# Altium schematic symbol library SparkFun.SCHLIB: 796 symbols (part 5 of 5) (continued)
## USD-SOCKETNEW
designator U?, comment microSD SocketPush-push type uSD socket. Schematic element and footprint production proven. Spark Fun Electronics SKU : PRT-00127. tDoc lines correctly indicate media card edge positions when inserting (unlocked, locked, depressed).
footprint MICRO-SD-SOCKET-PP
pins: 1 NC, 2 CS, 3 DI, 4 VCC, 5 SCK, 6 GND, 7 DO, 8 RSV, CD1 SHIELD@2, CD2 SHIELD@4, GND1 SHIELD@3, GND3 SHIELD@1

## USD-SOCKETUSD
designator U?, comment microSD SocketPush-push type uSD socket. Schematic element and footprint production proven. Spark Fun Electronics SKU : PRT-00127. tDoc lines correctly indicate media card edge positions when inserting (unlocked, locked, depressed).
footprint USD-SOCKET-PP
pins: 1 NC, 2 CS, 3 DI, 4 VCC, 5 SCK, 6 GND, 7 DO, 8 RSV, CD1 SHIELD@1, CD2 SHIELD@2, GND1 SHIELD@3, GND2 SHIELD@4

## V18ZA2P
designator ?
footprint V18ZA2P
pins: P$1, P$2

## V-REFERENCESMD
designator ?
footprint SOT23-3
pins: 1 C, 2 A

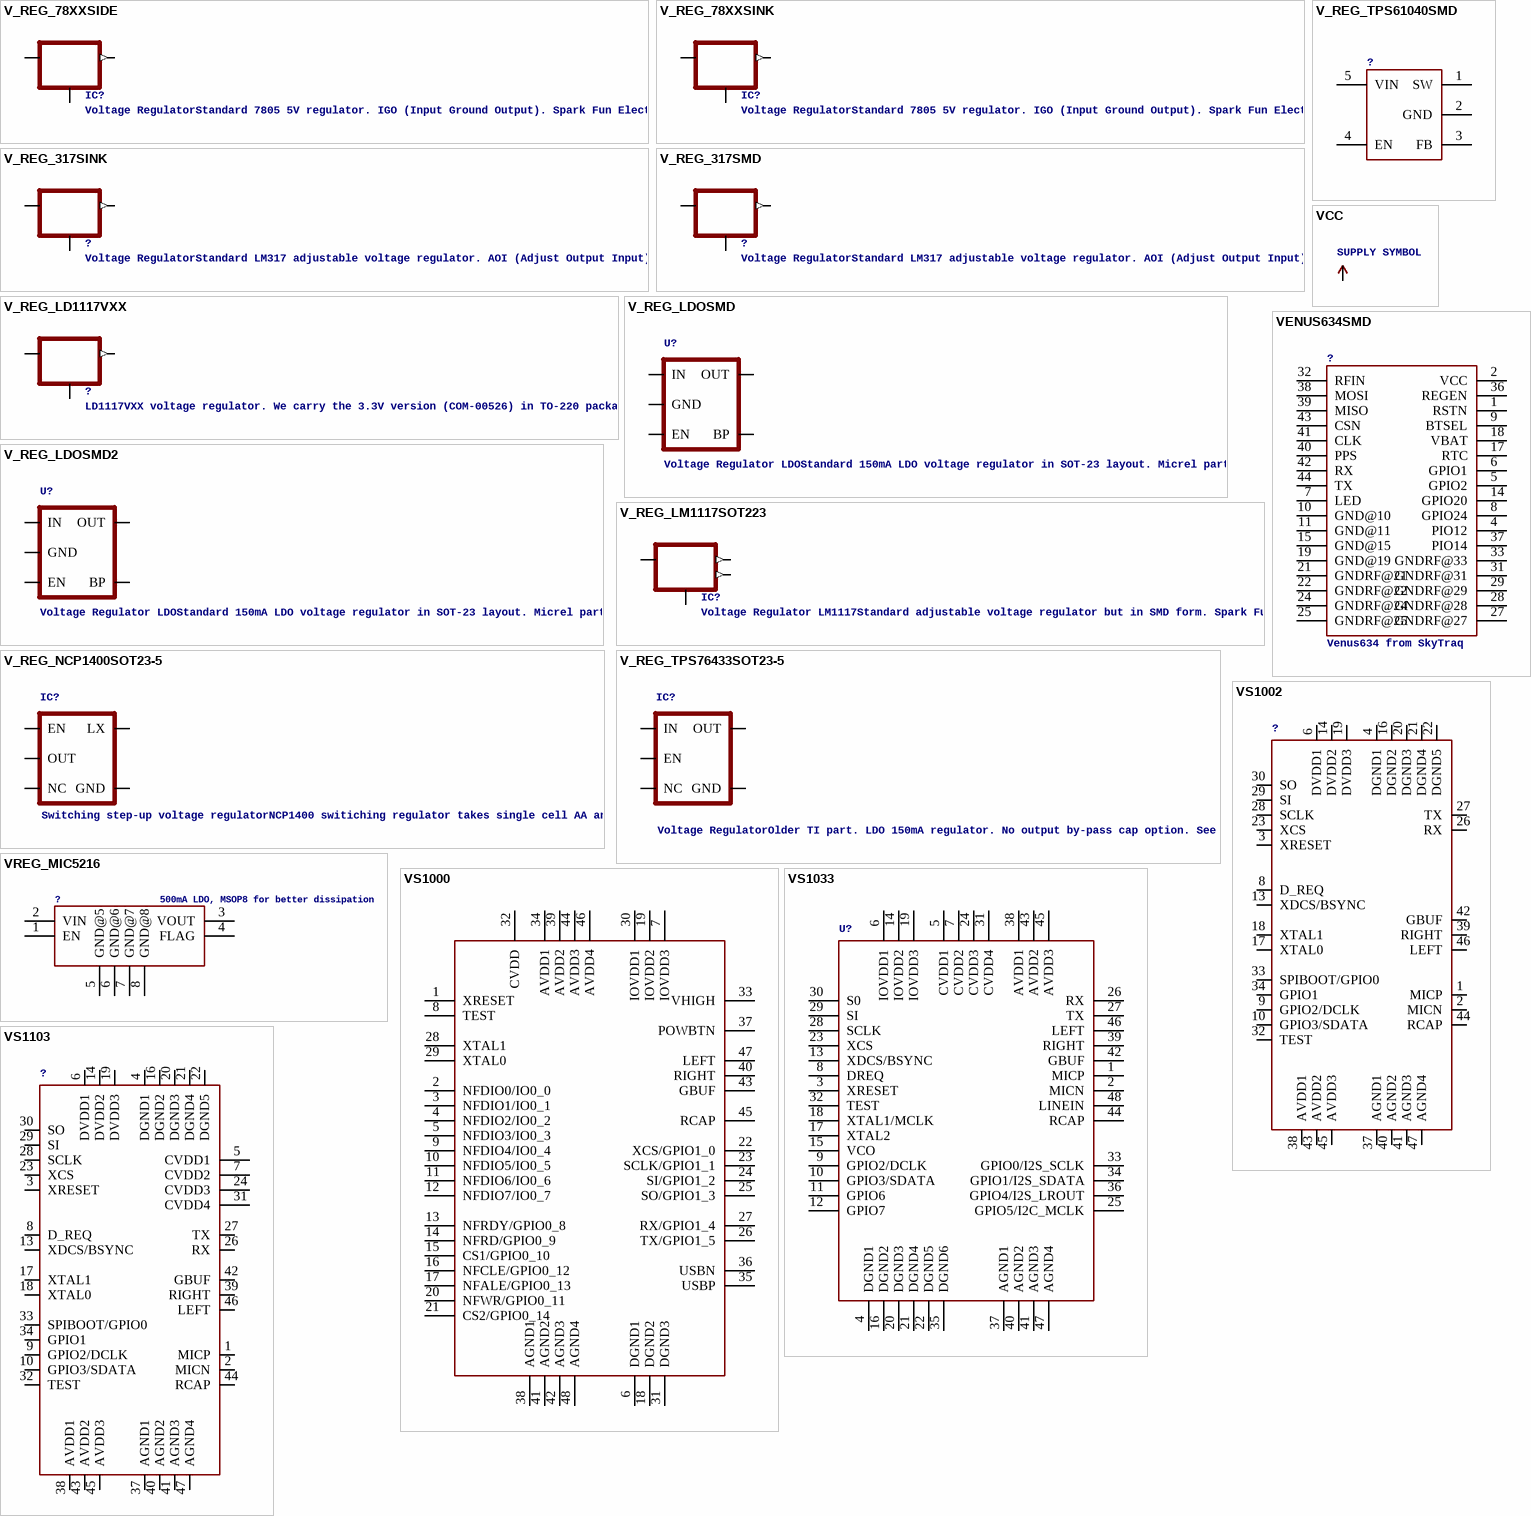
[diagram p34: symbols V_REG_78XXSIDE to VS1103]

## V_REG_78XXSIDE
designator IC?, comment Voltage RegulatorStandard 7805 5V regulator. IGO (Input Ground Output). Spark Fun Electronics SKU : COM-00107
footprint 78XXL
pins: GND, IN, OUT (out)

## V_REG_78XXSINK
designator IC?, comment Voltage RegulatorStandard 7805 5V regulator. IGO (Input Ground Output). Spark Fun Electronics SKU : COM-00107
footprint TO220-IGO
pins: GND, IN, OUT (out)

## V_REG_317SINK
designator ?, comment Voltage RegulatorStandard LM317 adjustable voltage regulator. AOI (Adjust Output Input). Google 'LM317 Calculator' for easy to use app to get the two resistor values needed. 240/720 for 5V output. 240/390 for 3.3V output. Spark Fun Electronics SKU : COM-00527
footprint TO220-ADJ
pins: ADJ, IN, OUT (out)

## V_REG_317SMD
designator ?, comment Voltage RegulatorStandard LM317 adjustable voltage regulator. AOI (Adjust Output Input). Google 'LM317 Calculator' for easy to use app to get the two resistor values needed. 240/720 for 5V output. 240/390 for 3.3V output. Spark Fun Electronics SKU : COM-00527
footprint SOT223
pins: 1 ADJ, 2 OUT (out), 3 IN

## V_REG_LD1117VXX
designator ?, comment LD1117VXX voltage regulator. We carry the 3.3V version (COM-00526) in TO-220 package.
footprint 78XXL
pins: GND OUT (out), IN GND, OUT IN

## V_REG_LDOSMD
designator U?, comment Voltage Regulator LDOStandard 150mA LDO voltage regulator in SOT-23 layout. Micrel part MIC5205. BP (by-pass) pin is used to lower output noise with 470pF cap.
footprint SOT23-5
pins: 1 IN, 2 GND, 3 EN, 4 BP, 5 OUT

## V_REG_LDOSMD2
designator U?, comment Voltage Regulator LDOStandard 150mA LDO voltage regulator in SOT-23 layout. Micrel part MIC5205. BP (by-pass) pin is used to lower output noise with 470pF cap.
footprint SC70
pins: 1 IN, 2 GND, 3 EN, 4 BP, 5 OUT

## V_REG_LM1117SOT223
designator IC?, comment Voltage Regulator LM1117Standard adjustable voltage regulator but in SMD form. Spark Fun Electronics SKU : COM-00595
footprint SOT223
pins: 1 ADJ, 2 OUT (out), 3 IN, 4 OUT@1 (out)

## V_REG_NCP1400SOT23-5
designator IC?, comment Switching step-up voltage regulatorNCP1400 switiching regulator takes single cell AA and outputs 100mA at 3.3V or 5V with minimal number of external components.
footprint SOT23-5
pins: 1 EN, 2 OUT, 3 NC, 4 GND, 5 LX

## V_REG_TPS61040SMD
designator ?
footprint SOT23-5
pins: 1 SW, 2 GND, 3 FB, 4 EN, 5 VIN

## V_REG_TPS76433SOT23-5
designator IC?, comment Voltage RegulatorOlder TI part. LDO 150mA regulator. No output by-pass cap option. See V_REG_LDO for a better part.
footprint SOT23-5
pins: 1 IN, 2 GND, 3 EN, 4 NC, 5 OUT

## VCC
designator P+?, comment SUPPLY SYMBOL
pins: ?1 VCC (oe)

## VENUS634SMD
designator ?, comment Venus634 from SkyTraq
footprint LGA44
pins: 1 RSTN, 2 VCC, 4 PIO12, 5 GPIO2, 6 GPIO1, 7 LED, 8 GPIO24, 9 BTSEL, 10 GND@10, 11 GND@11, 14 GPIO20, 15 GND@15, 17 RTC, 18 VBAT, 19 GND@19, 21 GNDRF@21, 22 GNDRF@22, 24 GNDRF@24, 25 GNDRF@25, 27 GNDRF@27, 28 GNDRF@28, 29 GNDRF@29, 31 GNDRF@31, 32 RFIN, 33 GNDRF@33, 36 REGEN, 37 PIO14, 38 MOSI, 39 MISO, 40 PPS, 41 CLK, 42 RX, 43 CSN, 44 TX

## VREG_MIC5216
designator ?, comment 500mA LDO, MSOP8 for better dissipation
footprint MSOP8
pins: 1 EN, 2 VIN, 3 VOUT, 4 FLAG, 5 GND@5, 6 GND@6, 7 GND@7, 8 GND@8

## VS1000
designator ?
footprint LQFP-48
pins: 1 XRESET, 2 NFDIO0/IO0_0, 3 NFDIO1/IO0_1, 4 NFDIO2/IO0_2, 5 NFDIO3/IO0_3, 6 DGND1, 7 IOVDD3, 8 TEST, 9 NFDIO4/IO0_4, 10 NFDIO5/IO0_5, 11 NFDIO6/IO0_6, 12 NFDIO7/IO0_7, 13 NFRDY/GPIO0_8, 14 NFRD/GPIO0_9, 15 CS1/GPIO0_10, 16 NFCLE/GPIO0_12, 17 NFALE/GPIO0_13, 18 DGND2, 19 IOVDD2, 20 NFWR/GPIO0_11, 21 CS2/GPIO0_14, 22 XCS/GPIO1_0, 23 SCLK/GPIO1_1, 24 SI/GPIO1_2, 25 SO/GPIO1_3, 26 TX/GPIO1_5, 27 RX/GPIO1_4, 28 XTAL1, 29 XTAL0, 30 IOVDD1, 31 DGND3, 32 CVDD, 33 VHIGH, 34 AVDD1, 35 USBP, 36 USBN, 37 POWBTN, 38 AGND1, 39 AVDD2, 40 RIGHT, 41 AGND2, 42 AGND3, 43 GBUF, 44 AVDD3, 45 RCAP, 46 AVDD4, 47 LEFT, 48 AGND4

## VS1002
designator ?
footprint LQFP-48
pins: 1 MICP, 2 MICN, 3 XRESET, 4 DGND1 (power), 6 DVDD1 (power), 8 D_REQ, 9 GPIO2/DCLK, 10 GPIO3/SDATA, 13 XDCS/BSYNC, 14 DVDD2 (power), 16 DGND2, 17 XTAL0, 18 XTAL1, 19 DVDD3 (power), 20 DGND3, 21 DGND4, 22 DGND5, 23 XCS, 26 RX, 27 TX, 28 SCLK, 29 SI, 30 SO, 32 TEST, 33 SPIBOOT/GPIO0, 34 GPIO1, 37 AGND1, 38 AVDD1 (power), 39 RIGHT, 40 AGND2, 41 AGND3, 42 GBUF, 43 AVDD2 (power), 44 RCAP, 45 AVDD3 (power), 46 LEFT, 47 AGND4

## VS1033
designator U?
footprint LQFP-48
pins: 1 MICP, 2 MICN, 3 XRESET, 4 DGND1, 5 CVDD1, 6 IOVDD1, 7 CVDD2, 8 DREQ, 9 GPIO2/DCLK, 10 GPIO3/SDATA, 11 GPIO6, 12 GPIO7, 13 XDCS/BSYNC, 14 IOVDD2, 15 VCO, 16 DGND2, 17 XTAL2, 18 XTAL1/MCLK, 19 IOVDD3, 20 DGND3, 21 DGND4, 22 DGND5, 23 XCS, 24 CVDD3, 25 GPIO5/I2C_MCLK, 26 RX, 27 TX, 28 SCLK, 29 SI, 30 S0, 31 CVDD4, 32 TEST, 33 GPIO0/I2S_SCLK, 34 GPIO1/I2S_SDATA, 35 DGND6, 36 GPIO4/I2S_LROUT, 37 AGND1, 38 AVDD1, 39 RIGHT, 40 AGND2, 41 AGND3, 42 GBUF, 43 AVDD2, 44 RCAP, 45 AVDD3, 46 LEFT, 47 AGND4, 48 LINEIN

## VS1103
designator ?
footprint LQFP-48
pins: 1 MICP, 2 MICN, 3 XRESET, 4 DGND1 (power), 5 CVDD1, 6 DVDD1 (power), 7 CVDD2, 8 D_REQ, 9 GPIO2/DCLK, 10 GPIO3/SDATA, 13 XDCS/BSYNC, 14 DVDD2 (power), 16 DGND2, 17 XTAL1, 18 XTAL0, 19 DVDD3 (power), 20 DGND3, 21 DGND4, 22 DGND5, 23 XCS, 24 CVDD3, 26 RX, 27 TX, 28 SCLK, 29 SI, 30 SO, 31 CVDD4, 32 TEST, 33 SPIBOOT/GPIO0, 34 GPIO1, 37 AGND1, 38 AVDD1 (power), 39 RIGHT, 40 AGND2, 41 AGND3, 42 GBUF, 43 AVDD2 (power), 44 RCAP, 45 AVDD3 (power), 46 LEFT, 47 AGND4

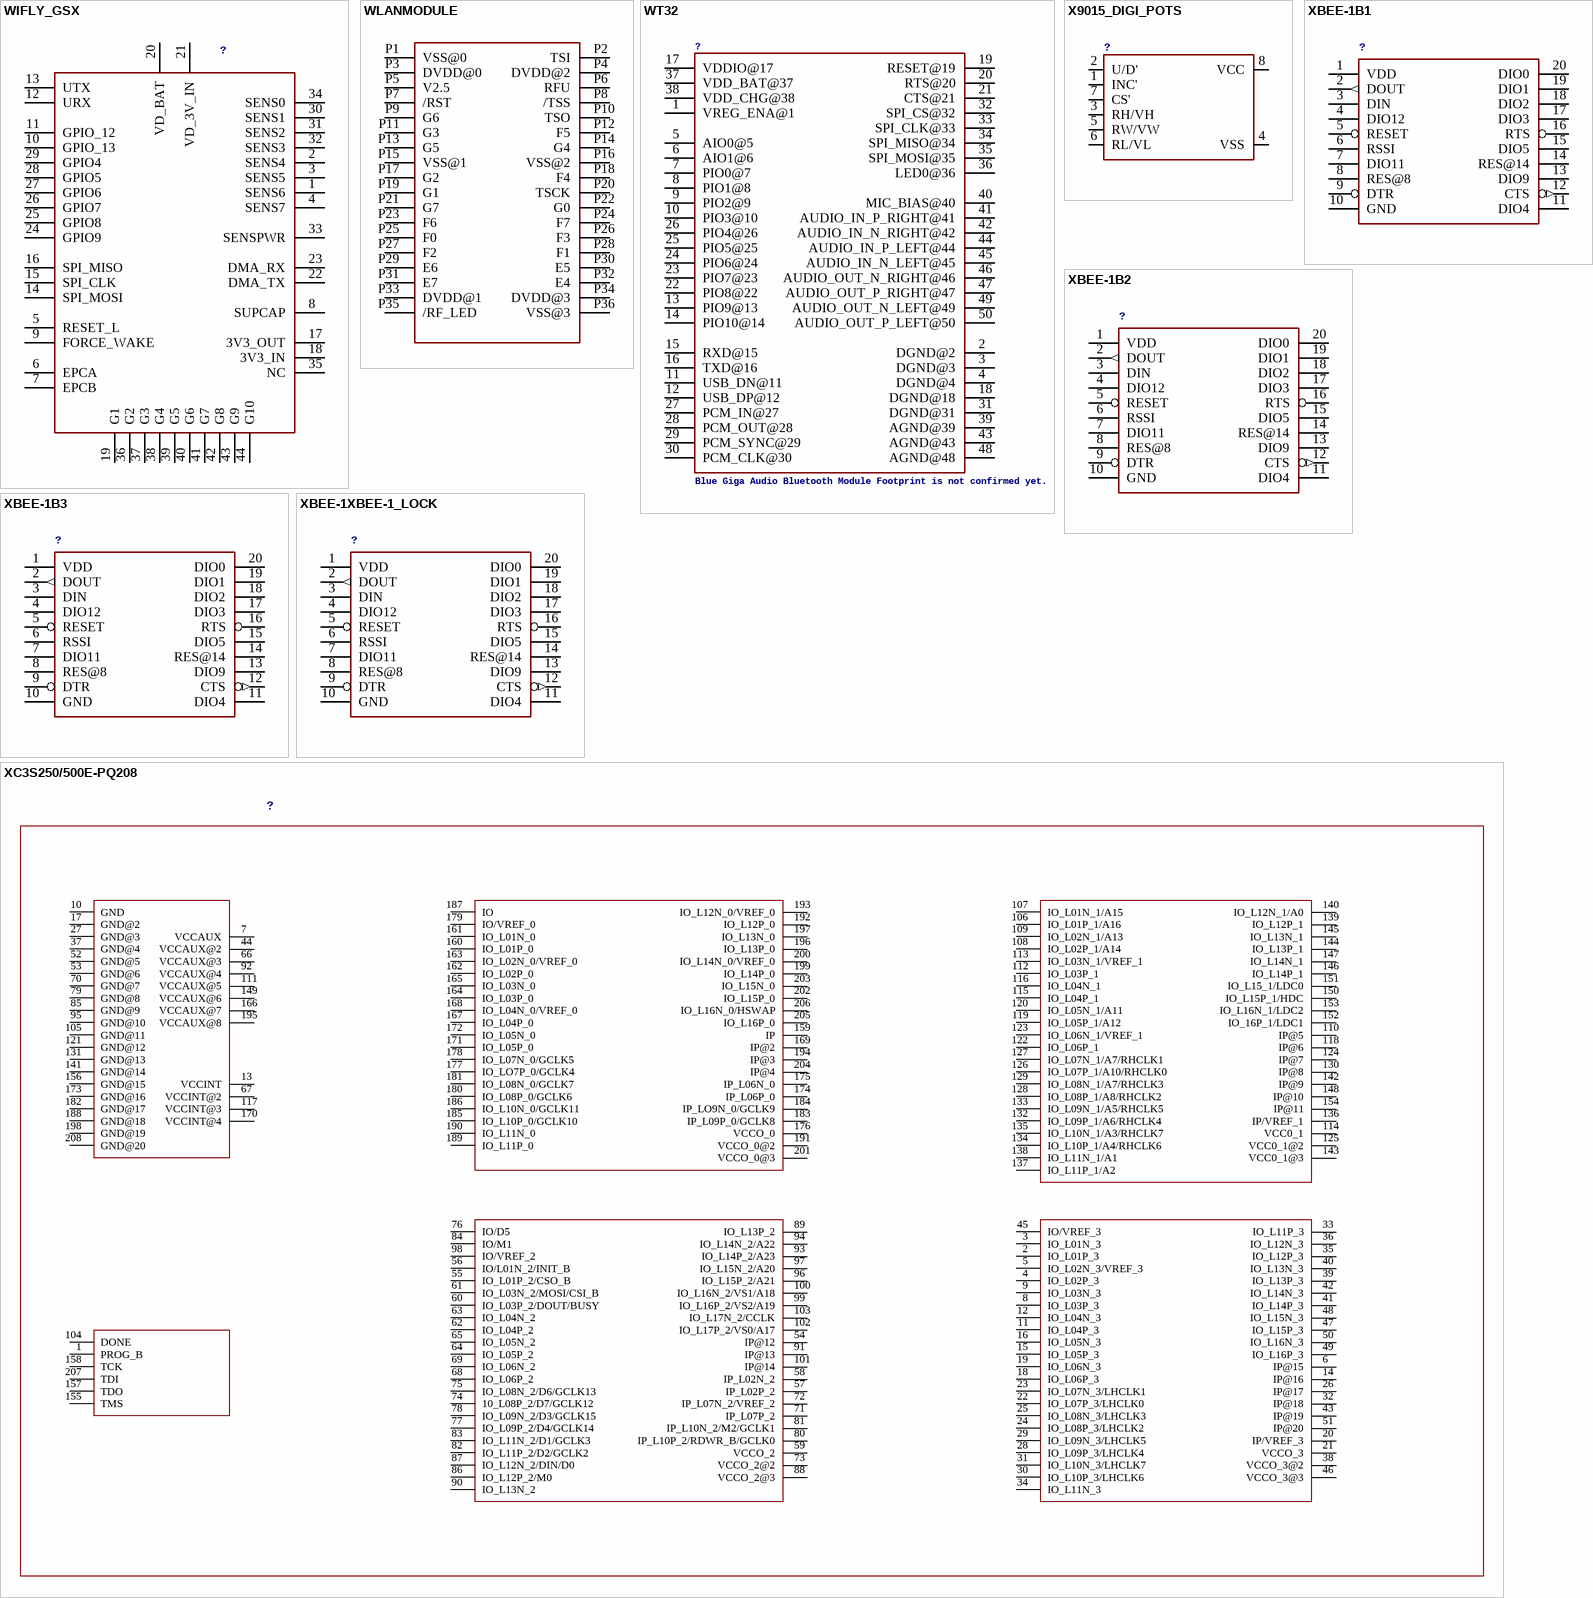
[diagram p35: symbols WIFLY_GSX to XC3S250/500E-PQ208]

## WIFLY_GSX
designator ?
footprint WIFLY_GSX
pins: 1 SENS6, 2 SENS4, 3 SENS5, 4 SENS7, 5 RESET_L, 6 EPCA, 7 EPCB, 8 SUPCAP, 9 FORCE_WAKE, 10 GPIO_13, 11 GPIO_12, 12 URX, 13 UTX, 14 SPI_MOSI, 15 SPI_CLK, 16 SPI_MISO, 17 3V3_OUT, 18 3V3_IN, 19 G1, 20 VD_BAT, 21 VD_3V_IN, 22 DMA_TX, 23 DMA_RX, 24 GPIO9, 25 GPIO8, 26 GPIO7, 27 GPIO6, 28 GPIO5, 29 GPIO4, 30 SENS1, 31 SENS2, 32 SENS3, 33 SENSPWR, 34 SENS0, 35 NC, 36 G2, 37 G3, 38 G4, 39 G5, 40 G6, 41 G7, 42 G8, 43 G9, 44 G10

## WLANMODULE
designator ?, comment DPAC WiFi ModuleFootprint for DPAC wireless module. Not fully tested so double check it. Spark Fun Electronics SKU : (Module) WRL-00665, (Connector) WRL-00673  (value not drawn)
footprint WLANMODULE
pins: P1 VSS@0, P2 TSI, P3 DVDD@0, P4 DVDD@2, P5 V2.5, P6 RFU, P7 /RST, P8 /TSS, P9 G6, P10 TSO, P11 G3, P12 F5, P13 G5, P14 G4, P15 VSS@1, P16 VSS@2, P17 G2, P18 F4, P19 G1, P20 TSCK, P21 G7, P22 G0, P23 F6, P24 F7, P25 F0, P26 F3, P27 F2, P28 F1, P29 E6, P30 E5, P31 E7, P32 E4, P33 DVDD@1, P34 DVDD@3, P35 /RF_LED, P36 VSS@3

## WT32
designator ?, comment Blue Giga Audio Bluetooth Module Footprint is not confirmed yet.
footprint WT32
pins: 1 VREG_ENA@1, 2 DGND@2, 3 DGND@3, 4 DGND@4, 5 AIO0@5, 6 AIO1@6, 7 PIO0@7, 8 PIO1@8, 9 PIO2@9, 10 PIO3@10, 11 USB_DN@11, 12 USB_DP@12, 13 PIO9@13, 14 PIO10@14, 15 RXD@15, 16 TXD@16, 17 VDDIO@17, 18 DGND@18, 19 RESET@19, 20 RTS@20, 21 CTS@21, 22 PIO8@22, 23 PIO7@23, 24 PIO6@24, 25 PIO5@25, 26 PIO4@26, 27 PCM_IN@27, 28 PCM_OUT@28, 29 PCM_SYNC@29, 30 PCM_CLK@30, 31 DGND@31, 32 SPI_CS@32, 33 SPI_CLK@33, 34 SPI_MISO@34, 35 SPI_MOSI@35, 36 LED0@36, 37 VDD_BAT@37, 38 VDD_CHG@38, 39 AGND@39, 40 MIC_BIAS@40, 41 AUDIO_IN_P_RIGHT@41, 42 AUDIO_IN_N_RIGHT@42, 43 AGND@43, 44 AUDIO_IN_P_LEFT@44, 45 AUDIO_IN_N_LEFT@45, 46 AUDIO_OUT_N_RIGHT@46, 47 AUDIO_OUT_P_RIGHT@47, 48 AGND@48, 49 AUDIO_OUT_N_LEFT@49, 50 AUDIO_OUT_P_LEFT@50

## X9015_DIGI_POTS
designator ?
footprint SO08
pins: 1 INC', 2 U/D', 3 RH/VH, 4 VSS (power), 5 RW/VW, 6 RL/VL, 7 CS', 8 VCC (power)

## XBEE-1B1
designator ?
footprint XBEE-1
pins: 1 VDD (power), 2 DOUT (out), 3 DIN, 4 DIO12, 5 RESET, 6 RSSI, 7 DIO11, 8 RES@8, 9 DTR, 10 GND (power), 11 DIO4, 12 CTS (out), 13 DIO9, 14 RES@14, 15 DIO5, 16 RTS, 17 DIO3, 18 DIO2, 19 DIO1, 20 DIO0

## XBEE-1B2
designator ?
footprint XBEE-SILK
pins: 1 VDD (power), 2 DOUT (out), 3 DIN, 4 DIO12, 5 RESET, 6 RSSI, 7 DIO11, 8 RES@8, 9 DTR, 10 GND (power), 11 DIO4, 12 CTS (out), 13 DIO9, 14 RES@14, 15 DIO5, 16 RTS, 17 DIO3, 18 DIO2, 19 DIO1, 20 DIO0

## XBEE-1B3
designator ?
footprint XBEE-SMD
pins: 1 VDD (power), 2 DOUT (out), 3 DIN, 4 DIO12, 5 RESET, 6 RSSI, 7 DIO11, 8 RES@8, 9 DTR, 10 GND (power), 11 DIO4, 12 CTS (out), 13 DIO9, 14 RES@14, 15 DIO5, 16 RTS, 17 DIO3, 18 DIO2, 19 DIO1, 20 DIO0

## XBEE-1XBEE-1_LOCK
designator ?
footprint XBEE-1_LOCK
pins: 1 VDD (power), 2 DOUT (out), 3 DIN, 4 DIO12, 5 RESET, 6 RSSI, 7 DIO11, 8 RES@8, 9 DTR, 10 GND (power), 11 DIO4, 12 CTS (out), 13 DIO9, 14 RES@14, 15 DIO5, 16 RTS, 17 DIO3, 18 DIO2, 19 DIO1, 20 DIO0

## XC3S250/500E-PQ208
designator ?
footprint PQ208
pins: 1 PROG_B, 2 IO_L01P_3, 3 IO_L01N_3, 4 IO_L02P_3, 5 IO_L02N_3/VREF_3, 6 IP@15, 7 VCCAUX, 8 IO_L03P_3, 9 IO_L03N_3, 10 GND, 11 IO_L04P_3, 12 IO_L04N_3, 13 VCCINT, 14 IP@16, 15 IO_L05P_3, 16 IO_L05N_3, 17 GND@2, 18 IO_L06P_3, 19 IO_L06N_3, 20 IP/VREF_3, 21 VCCO_3, 22 IO_L07P_3/LHCLK0, 23 IO_L07N_3/LHCLK1, 24 IO_L08P_3/LHCLK2, 25 IO_L08N_3/LHCLK3, 26 IP@17, 27 GND@3, 28 IO_L09P_3/LHCLK4, 29 IO_L09N_3/LHCLK5, 30 IO_L10P_3/LHCLK6, 31 IO_L10N_3/LHCLK7, 32 IP@18, 33 IO_L11P_3, 34 IO_L11N_3, 35 IO_L12P_3, 36 IO_L12N_3, 37 GND@4, 38 VCCO_3@2, 39 IO_L13P_3, 40 IO_L13N_3, 41 IO_L14P_3, 42 IO_L14N_3, 43 IP@19, 44 VCCAUX@2, 45 IO/VREF_3, 46 VCCO_3@3, 47 IO_L15P_3, 48 IO_L15N_3, 49 IO_L16P_3, 50 IO_L16N_3, 51 IP@20, 52 GND@5, 53 GND@6, 54 IP@12, 55 IO_L01P_2/CSO_B, 56 IO/L01N_2/INIT_B, 57 IP_L02P_2, 58 IP_L02N_2, 59 VCCO_2, 60 IO_L03P_2/DOUT/BUSY, 61 IO_L03N_2/MOSI/CSI_B, 62 IO_L04P_2, 63 IO_L04N_2, 64 IO_L05P_2, 65 IO_L05N_2, 66 VCCAUX@3, 67 VCCINT@2, 68 IO_L06P_2, 69 IO_L06N_2, 70 GND@7, 71 IP_L07P_2, 72 IP_L07N_2/VREF_2, 73 VCCO_2@2, 74 10_L08P_2/D7/GCLK12, 75 IO_L08N_2/D6/GCLK13, 76 IO/D5, 77 IO_L09P_2/D4/GCLK14, 78 IO_L09N_2/D3/GCLK15, 79 GND@8, 80 IP_L10P_2/RDWR_B/GCLK0, 81 IP_L10N_2/M2/GCLK1, 82 IO_L11P_2/D2/GCLK2, 83 IO_L11N_2/D1/GCLK3, 84 IO/M1, 85 GND@9, 86 IO_L12P_2/M0, 87 IO_L12N_2/DIN/D0, 88 VCCO_2@3, 89 IO_L13P_2, 90 IO_L13N_2, 91 IP@13, 92 VCCAUX@4, 93 IO_L14P_2/A23, 94 IO_L14N_2/A22, 95 GND@10, 96 IO_L15P_2/A21, 97 IO_L15N_2/A20, 98 IO/VREF_2, 99 IO_L16P_2/VS2/A19, 100 IO_L16N_2/VS1/A18, 101 IP@14, 102 IO_L17P_2/VS0/A17, 103 IO_L17N_2/CCLK, 104 DONE, 105 GND@11, 106 IO_L01P_1/A16, 107 IO_L01N_1/A15, 108 IO_L02P_1/A14, 109 IO_L02N_1/A13, 110 IP@5, 111 VCCAUX@5, 112 IO_L03P_1, 113 IO_L03N_1/VREF_1, 114 VCC0_1, 115 IO_L04P_1, 116 IO_L04N_1, 117 VCCINT@3, 118 IP@6, 119 IO_L05P_1/A12, 120 IO_L05N_1/A11, 121 GND@12, 122 IO_L06P_1, 123 IO_L06N_1/VREF_1, 124 IP@7, 125 VCC0_1@2, 126 IO_L07P_1/A10/RHCLK0, 127 IO_L07N_1/A7/RHCLK1, 128 IO_L08P_1/A8/RHCLK2, 129 IO_L08N_1/A7/RHCLK3, 130 IP@8, 131 GND@13, 132 IO_L09P_1/A6/RHCLK4, 133 IO_L09N_1/A5/RHCLK5, 134 IO_L10P_1/A4/RHCLK6, 135 IO_L10N_1/A3/RHCLK7, 136 IP/VREF_1, 137 IO_L11P_1/A2, 138 IO_L11N_1/A1, 139 IO_L12P_1, 140 IO_L12N_1/A0, 141 GND@14, 142 IP@9, 143 VCC0_1@3, 144 IO_L13P_1, 145 IO_L13N_1, 146 IO_L14P_1, 147 IO_L14N_1, 148 IP@10, 149 VCCAUX@6, 150 IO_L15P_1/HDC, 151 IO_L15_1/LDC0, 152 IO_16P_1/LDC1, 153 IO_L16N_1/LDC2, 154 IP@11, 155 TMS, 156 GND@15, 157 TDO, 158 TCK, 159 IP, 160 IO_L01P_0, 161 IO_L01N_0, 162 IO_L02P_0, 163 IO_L02N_0/VREF_0, 164 IO_L03P_0, 165 IO_L03N_0, 166 VCCAUX@7, 167 IO_L04P_0, 168 IO_L04N_0/VREF_0, 169 IP@2, 170 VCCINT@4, 171 IO_L05P_0, 172 IO_L05N_0, 173 GND@16, 174 IP_L06P_0, 175 IP_L06N_0, 176 VCCO_0, 177 IO_LO7P_0/GCLK4, 178 IO_L07N_0/GCLK5, 179 IO/VREF_0, 180 IO_L08P_0/GCLK6, 181 IO_L08N_0/GCLK7, 182 GND@17, 183 IP_L09P_0/GCLK8, 184 IP_LO9N_0/GCLK9, 185 IO_L10P_0/GCLK10, 186 IO_L10N_0/GCLK11, 187 IO, 188 GND@18, 189 IO_L11P_0, 190 IO_L11N_0, 191 VCCO_0@2, 192 IO_L12P_0, 193 IO_L12N_0/VREF_0, 194 IP@3, 195 VCCAUX@8, 196 IO_L13P_0, 197 IO_L13N_0, 198 GND@19, 199 IO_L14P_0, 200 IO_L14N_0/VREF_0, 201 VCCO_0@3, 202 IO_L15P_0, 203 IO_L15N_0, 204 IP@4, 205 IO_L16P_0, 206 IO_L16N_0/HSWAP, 207 TDI, 208 GND@20

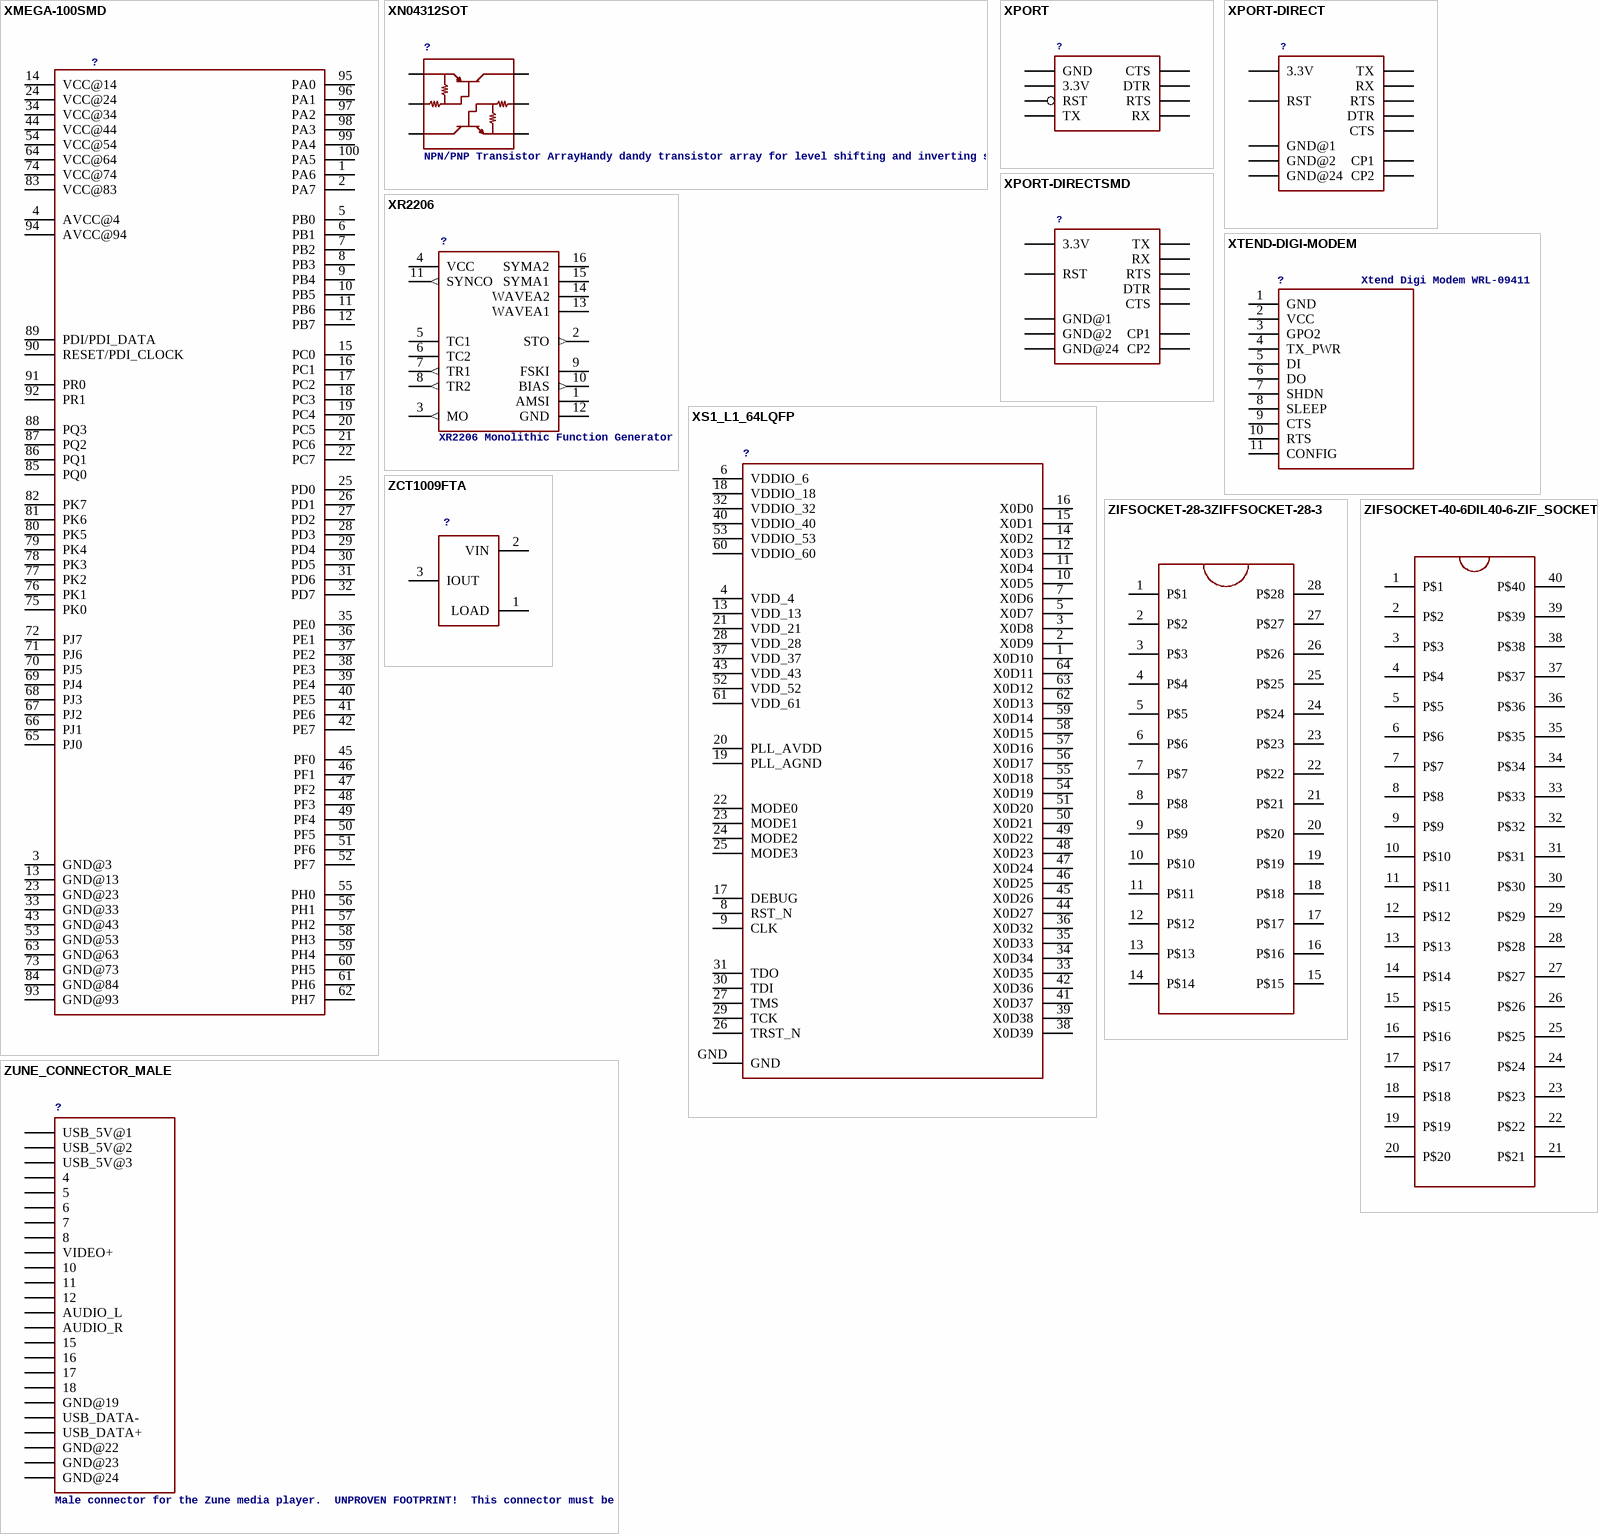
[diagram p36: symbols XMEGA-100SMD to ZUNE_CONNECTOR_MALE]

## XMEGA-100SMD
designator ?
footprint TQFP-100
pins: 1 PA6, 2 PA7, 3 GND@3, 4 AVCC@4, 5 PB0, 6 PB1, 7 PB2, 8 PB3, 9 PB4, 10 PB5, 11 PB6, 12 PB7, 13 GND@13, 14 VCC@14, 15 PC0, 16 PC1, 17 PC2, 18 PC3, 19 PC4, 20 PC5, 21 PC6, 22 PC7, 23 GND@23, 24 VCC@24, 25 PD0, 26 PD1, 27 PD2, 28 PD3, 29 PD4, 30 PD5, 31 PD6, 32 PD7, 33 GND@33, 34 VCC@34, 35 PE0, 36 PE1, 37 PE2, 38 PE3, 39 PE4, 40 PE5, 41 PE6, 42 PE7, 43 GND@43, 44 VCC@44, 45 PF0, 46 PF1, 47 PF2, 48 PF3, 49 PF4, 50 PF5, 51 PF6, 52 PF7, 53 GND@53, 54 VCC@54, 55 PH0, 56 PH1, 57 PH2, 58 PH3, 59 PH4, 60 PH5, 61 PH6, 62 PH7, 63 GND@63, 64 VCC@64, 65 PJ0, 66 PJ1, 67 PJ2, 68 PJ3, 69 PJ4, 70 PJ5, 71 PJ6, 72 PJ7, 73 GND@73, 74 VCC@74, 75 PK0, 76 PK1, 77 PK2, 78 PK3, 79 PK4, 80 PK5, 81 PK6, 82 PK7, 83 VCC@83, 84 GND@84, 85 PQ0, 86 PQ1, 87 PQ2, 88 PQ3, 89 PDI/PDI_DATA, 90 RESET/PDI_CLOCK, 91 PR0, 92 PR1, 93 GND@93, 94 AVCC@94, 95 PA0, 96 PA1, 97 PA2, 98 PA3, 99 PA4, 100 PA5

## XN04312SOT
designator ?, comment NPN/PNP Transistor ArrayHandy dandy transistor array for level shifting and inverting signals. Spark Fun Electronics SKU : COM-00588
footprint SOT23-6
pins: 1 C1, 2 B2, 3 E2, 4 C2, 5 B1, 6 E1

## XPORT
designator ?
footprint XPORT
pins: P1 GND, P2 3.3V, P3 RST, P4 TX, P5 RX, P6 RTS, P7 DTR, P8 CTS

## XPORT-DIRECT
designator ?
footprint XPORT_DIRECT_MODULE
pins: P1 GND@1, P2 GND@2, P3 3.3V, P5 RST, P7 TX, P9 RX, P11 RTS, P13 DTR, P15 CTS, P21 CP2, P23 CP1, P24 GND@24

## XPORT-DIRECTSMD
designator ?
footprint XPORT_DIRECT_MODULE-SMD
pins: P1 GND@1, P2 GND@2, P3 3.3V, P5 RST, P7 TX, P9 RX, P11 RTS, P13 DTR, P15 CTS, P21 CP2, P23 CP1, P24 GND@24

## XR2206
designator ?, comment XR2206 Monolithic Function Generator
footprint DIL16
pins: 1 AMSI, 2 STO (out), 3 MO (out), 4 VCC (power), 5 TC1, 6 TC2, 7 TR1 (out), 8 TR2 (out), 9 FSKI, 10 BIAS (out), 11 SYNCO (out), 12 GND (power), 13 WAVEA1, 14 WAVEA2, 15 SYMA1, 16 SYMA2

## XS1_L1_64LQFP
designator ?
footprint SQFP-S-10X10-64-XS1
pins: 1 X0D10, 2 X0D9, 3 X0D8, 4 VDD_4, 5 X0D7, 6 VDDIO_6, 7 X0D6, 8 RST_N, 9 CLK, 10 X0D5, 11 X0D4, 12 X0D3, 13 VDD_13, 14 X0D2, 15 X0D1, 16 X0D0, 17 DEBUG, 18 VDDIO_18, 19 PLL_AGND, 20 PLL_AVDD, 21 VDD_21, 22 MODE0, 23 MODE1, 24 MODE2, 25 MODE3, 26 TRST_N, 27 TMS, 28 VDD_28, 29 TCK, 30 TDI, 31 TDO, 32 VDDIO_32, 33 X0D35, 34 X0D34, 35 X0D33, 36 X0D32, 37 VDD_37, 38 X0D39, 39 X0D38, 40 VDDIO_40, 41 X0D37, 42 X0D36, 43 VDD_43, 44 X0D27, 45 X0D26, 46 X0D25, 47 X0D24, 48 X0D23, 49 X0D22, 50 X0D21, 51 X0D20, 52 VDD_52, 53 VDDIO_53, 54 X0D19, 55 X0D18, 56 X0D17, 57 X0D16, 58 X0D15, 59 X0D14, 60 VDDIO_60, 61 VDD_61, 62 X0D13, 63 X0D12, 64 X0D11, GND

## XTEND-DIGI-MODEM
designator ?, comment Xtend Digi Modem WRL-09411
footprint XTEND-DIGI-MODEM
pins: 1 GND, 2 VCC, 3 GPO2, 4 TX_PWR, 5 DI, 6 DO, 7 SHDN, 8 SLEEP, 9 CTS, 10 RTS, 11 CONFIG

## ZCT1009FTA
designator ?
footprint SOT23-3
pins: 1 LOAD, 2 VIN, 3 IOUT

## ZIFSOCKET-28-3ZIFFSOCKET-28-3
designator ?
footprint DIL28-3-ZIF_SOCKET
pins: 1 P$1, 2 P$2, 3 P$3, 4 P$4, 5 P$5, 6 P$6, 7 P$7, 8 P$8, 9 P$9, 10 P$10, 11 P$11, 12 P$12, 13 P$13, 14 P$14, 15 P$15, 16 P$16, 17 P$17, 18 P$18, 19 P$19, 20 P$20, 21 P$21, 22 P$22, 23 P$23, 24 P$24, 25 P$25, 26 P$26, 27 P$27, 28 P$28

## ZIFSOCKET-40-6DIL40-6-ZIF_SOCKET
designator ?
footprint DIL40-6-ZIF_SOCKET
pins: 1 P$1, 2 P$2, 3 P$3, 4 P$4, 5 P$5, 6 P$6, 7 P$7, 8 P$8, 9 P$9, 10 P$10, 11 P$11, 12 P$12, 13 P$13, 14 P$14, 15 P$15, 16 P$16, 17 P$17, 18 P$18, 19 P$19, 20 P$20, 21 P$21, 22 P$22, 23 P$23, 24 P$24, 25 P$25, 26 P$26, 27 P$27, 28 P$28, 29 P$29, 30 P$30, 31 P$31, 32 P$32, 33 P$33, 34 P$34, 35 P$35, 36 P$36, 37 P$37, 38 P$38, 39 P$39, 40 P$40

## ZUNE_CONNECTOR_MALE
designator ?, comment Male connector for the Zune media player.  UNPROVEN FOOTPRINT!  This connector must be used only with a 1.2mm PCB thickness.
footprint ZUNE_CONNECTOR_MALE
pins: P$1 USB_5V@1, P$2 USB_5V@2, P$3 USB_5V@3, P$4 4, P$5 5, P$6 6, P$7 7, P$8 8, P$9 VIDEO+, P$10 10, P$11 11, P$12 12, P$13 AUDIO_L, P$14 AUDIO_R, P$15 15, P$16 16, P$17 17, P$18 18, P$19 GND@19, P$20 USB_DATA-, P$21 USB_DATA+, P$22 GND@22, P$23 GND@23, P$24 GND@24